# Altium footprint library MyComponents_v2.5.PcbLib: 403 footprints (part 10 of 26)
Each footprint in its own frame and in the unit in brackets; x right, y up, seen from the top. Pads: shape width x height; smd on the part's side, far side on the other; paste and mask are expansions set on the pad; w line width, h text height; cw(c..) or ccw(c..) is an arc to the next point about the centre after c.
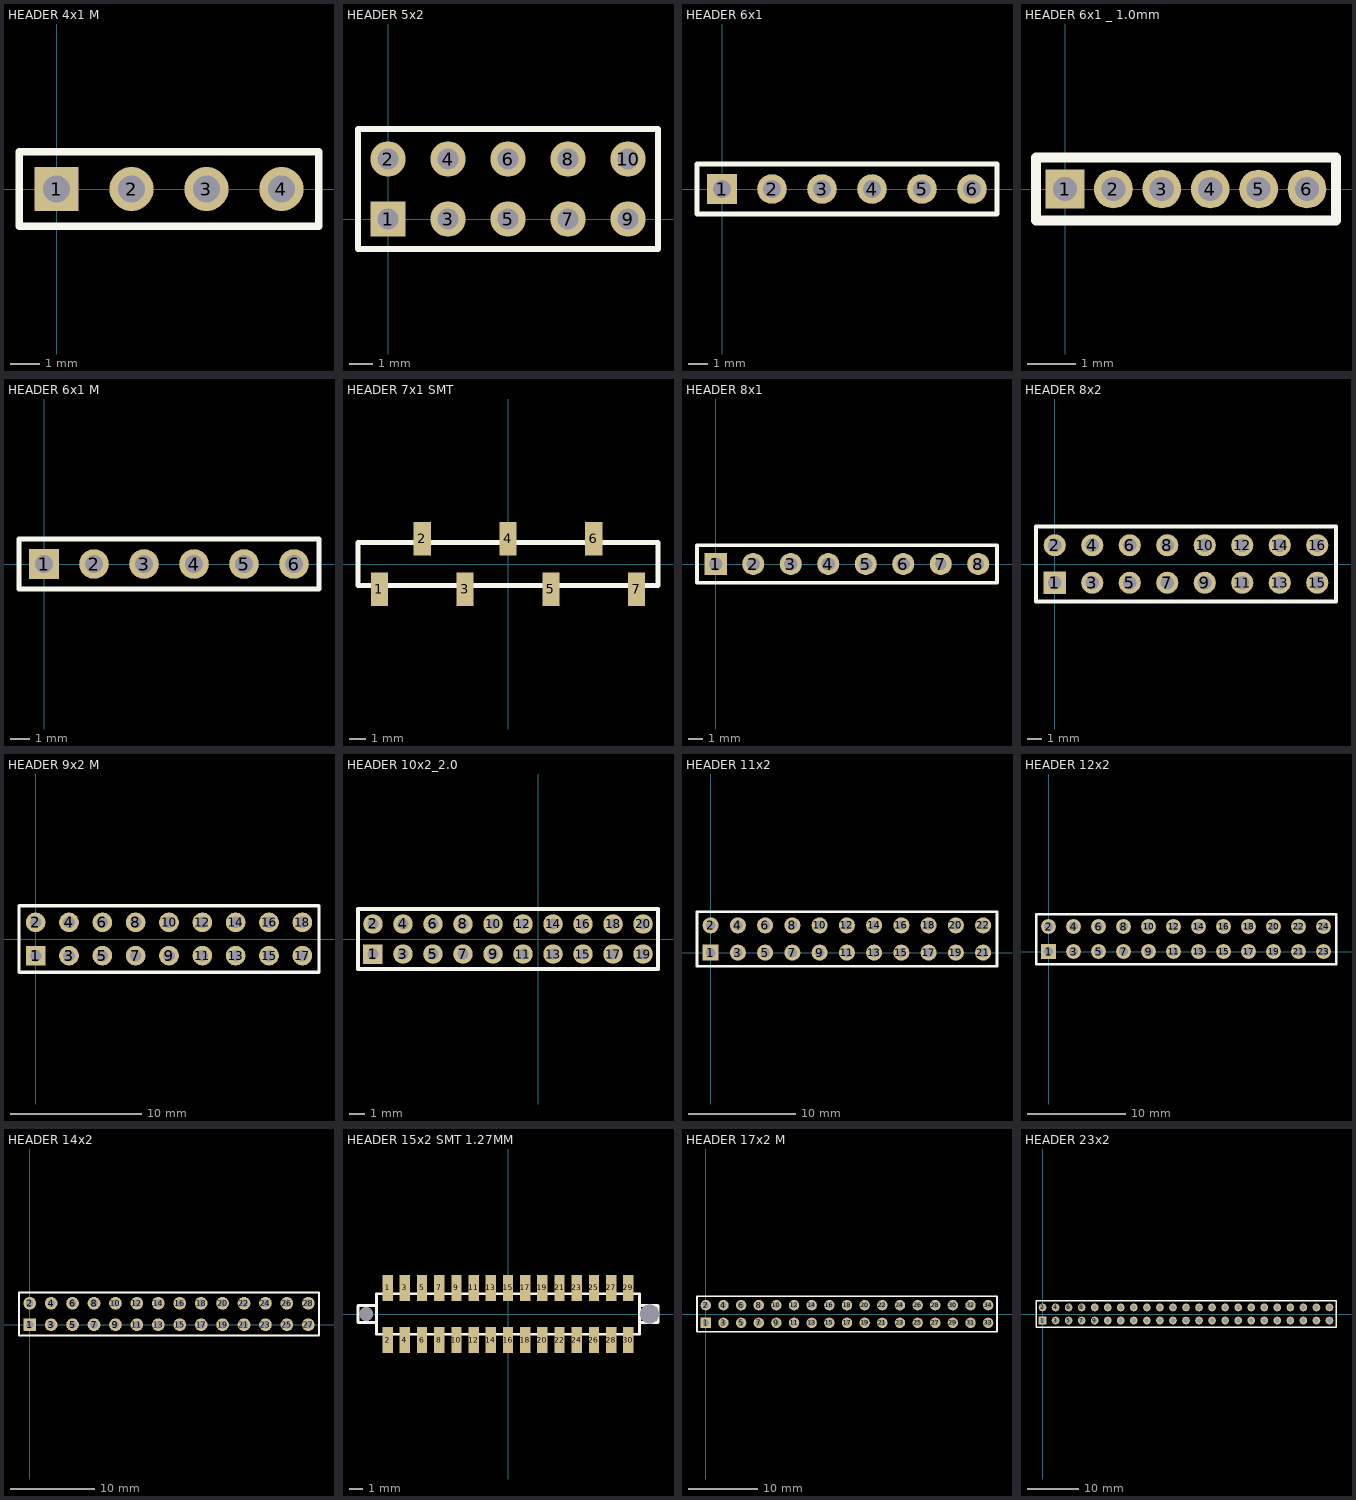
[diagram p9: the footprints below, top view; thin cyan lines are the x and y axes]

## HEADER 4x1 M [mm] "2.54mm排母"
pads (4):
  rect 1.5x1.5 hole 0.9: 1(0,0)
  round 1.5 hole 0.9: 2(2.54,0) 3(5.08,0) 4(7.62,0)
Top Overlay:
  lines w0.254: -1.27,-1.27 8.89,-1.27 8.89,1.27 -1.27,1.27 -1.27,-1.27
3D body "User Library-RM254_4pin.STEP": height 6.02, standoff -3.1, extent -1.27,-1.27 8.89,1.27

## HEADER 5x2 [mm] "2.54mm排针"
pads (10):
  rect 1.5x1.5 hole 0.9: 1(0,0)
  round 1.5 hole 0.9: 2(0,2.54) 3(2.54,0) 4(2.54,2.54) 5(5.08,0) 6(5.08,2.54) 7(7.62,0) 8(7.62,2.54) 9(10.16,0) 10(10.16,2.54)
Top Overlay:
  lines w0.254: -1.27,-1.27 -1.27,3.81 11.43,3.81 11.43,-1.27 -1.27,-1.27
3D body "mill-max-800-10-001-10-002000.STEP": height 6.36, standoff -3.42, extent 8.89,-1.27 11.43,1.27
3D body "mill-max-800-10-001-10-002000.STEP": height 6.36, standoff -3.42, extent 6.35,-1.27 8.89,1.27
3D body "mill-max-800-10-001-10-002000.STEP": height 6.36, standoff -3.42, extent 3.81,-1.27 6.35,1.27
3D body "mill-max-800-10-001-10-002000.STEP": height 6.36, standoff -3.42, extent 1.27,-1.27 3.81,1.27
3D body "mill-max-800-10-001-10-002000.STEP": height 6.36, standoff -3.42, extent 8.89,1.27 11.43,3.81
3D body "mill-max-800-10-001-10-002000.STEP": height 6.36, standoff -3.42, extent 6.35,1.27 8.89,3.81
3D body "mill-max-800-10-001-10-002000.STEP": height 6.36, standoff -3.42, extent 3.81,1.27 6.35,3.81
3D body "mill-max-800-10-001-10-002000.STEP": height 6.36, standoff -3.42, extent 1.27,1.27 3.81,3.81
3D body "mill-max-800-10-001-10-002000.STEP": height 6.36, standoff -3.42, extent -1.27,1.27 1.27,3.81
3D body "mill-max-800-10-001-10-002000.STEP": height 6.36, standoff -3.42, extent -1.27,-1.27 1.27,1.27

## HEADER 6x1 [mm] "2.54mm排针"
pads (6):
  rect 1.5x1.5 hole 0.9: 1(0,0)
  round 1.5 hole 0.9: 2(2.54,0) 3(5.08,0) 4(7.62,0) 5(10.16,0) 6(12.7,0)
Top Overlay:
  lines w0.254: -1.27,-1.27 -1.27,1.27 13.97,1.27 13.97,-1.27 -1.27,-1.27
3D body "mill-max-800-10-001-10-002000.STEP": height 6.39, standoff -3.39, extent -1.27,-1.27 1.27,1.27
3D body "mill-max-800-10-001-10-002000.STEP": height 6.39, standoff -3.39, extent 1.27,-1.27 3.81,1.27
3D body "mill-max-800-10-001-10-002000.STEP": height 6.39, standoff -3.39, extent 3.81,-1.27 6.35,1.27
3D body "mill-max-800-10-001-10-002000.STEP": height 6.39, standoff -3.39, extent 6.35,-1.27 8.89,1.27
3D body "mill-max-800-10-001-10-002000.STEP": height 6.39, standoff -3.39, extent 8.89,-1.27 11.43,1.27
3D body "mill-max-800-10-001-10-002000.STEP": height 6.39, standoff -3.39, extent 11.43,-1.27 13.97,1.27

## HEADER 6x1 _ 1.0mm [mm] "1.0mm 排母"
pads (6):
  rect 0.8x0.8 hole 0.5: 1(0,0)
  round 0.8 hole 0.5: 2(1,0) 3(2,0) 4(3,0) 5(4,0) 6(5,0)
Top Overlay:
  lines w0.2: -0.6,-0.65 5.6,-0.65 5.6,0.65 -0.6,0.65 -0.6,-0.65

## HEADER 6x1 M [mm] "2.54mm 排母"
pads (6):
  rect 1.5x1.5 hole 0.9: 1(0,0)
  round 1.5 hole 0.9: 2(2.54,0) 3(5.08,0) 4(7.62,0) 5(10.16,0) 6(12.7,0)
Top Overlay:
  lines w0.254: -1.27,-1.27 -1.27,1.27 13.97,1.27 13.97,-1.27 -1.27,-1.27
3D body "User Library-RM254_2pin.STEP": height 6.02, standoff -3.1, extent -1.27,-1.27 3.81,1.27
3D body "User Library-RM254_2pin.STEP": height 6.02, standoff -3.1, extent 3.81,-1.27 8.89,1.27
3D body "User Library-RM254_2pin.STEP": height 6.02, standoff -3.1, extent 8.89,-1.27 13.97,1.27

## HEADER 7x1 SMT [mm] "2.54mm贴片排母"
pads (7):
  rect 1.02x2 smd: 1(-7.62,-1.5) 2(-5.08,1.5) 3(-2.54,-1.5) 4(0,1.5) 5(2.54,-1.5) 6(5.08,1.5) 7(7.62,-1.5)
Top Overlay:
  lines w0.3: -8.89,-1.27 8.89,-1.27 8.89,1.27 -8.89,1.27 -8.89,-1.27
3D body "Female header 2.54mm 7.stp": height 6.2, standoff 0, extent -9.02,-2.575 9.02,2.575

## HEADER 8x1 [mm] "2.54mm排针"
pads (8):
  rect 1.5x1.5 hole 0.9: 1(0,0)
  round 1.5 hole 0.9: 2(2.54,0) 3(5.08,0) 4(7.62,0) 5(10.16,0) 6(12.7,0)
  round 1.5 hole 0.8: 7(15.24,0) 8(17.78,0)
Top Overlay:
  lines w0.254: -1.27,-1.27 19.05,-1.27 19.05,1.27 -1.27,1.27 -1.27,-1.27
3D body "mill-max-800-10-001-10-002000.STEP": height 6.39, standoff -3.39, extent 16.51,-1.27 19.05,1.27
3D body "mill-max-800-10-001-10-002000.STEP": height 6.39, standoff -3.39, extent 13.97,-1.27 16.51,1.27
3D body "mill-max-800-10-001-10-002000.STEP": height 6.39, standoff -3.39, extent 11.43,-1.27 13.97,1.27
3D body "mill-max-800-10-001-10-002000.STEP": height 6.39, standoff -3.39, extent 8.89,-1.27 11.43,1.27
3D body "mill-max-800-10-001-10-002000.STEP": height 6.39, standoff -3.39, extent 6.35,-1.27 8.89,1.27
3D body "mill-max-800-10-001-10-002000.STEP": height 6.39, standoff -3.39, extent 3.81,-1.27 6.35,1.27
3D body "mill-max-800-10-001-10-002000.STEP": height 6.39, standoff -3.39, extent 1.27,-1.27 3.81,1.27
3D body "mill-max-800-10-001-10-002000.STEP": height 6.39, standoff -3.39, extent -1.27,-1.27 1.27,1.27

## HEADER 8x2 [mm] "2.54mm排针"
pads (16):
  rect 1.5x1.5 hole 0.9: 1(0,-1.27)
  round 1.5 hole 0.9: 2(0,1.27) 3(2.54,-1.27) 4(2.54,1.27) 5(5.08,-1.27) 6(5.08,1.27) 7(7.62,-1.27) 8(7.62,1.27) 9(10.16,-1.27) 10(10.16,1.27) 11(12.7,-1.27) 12(12.7,1.27) 13(15.24,-1.27) 14(15.24,1.27) 15(17.78,-1.27) 16(17.78,1.27)
Top Overlay:
  lines w0.254: -1.27,-2.54 19.05,-2.54 19.05,2.54 -1.27,2.54 -1.27,-2.54
3D body "mill-max-800-10-004-10-002000.STEP": height 6.41, standoff -3.37, extent -1.27,-2.54 3.81,2.54
3D body "mill-max-800-10-004-10-002000.STEP": height 6.41, standoff -3.37, extent 3.81,-2.54 8.89,2.54
3D body "mill-max-800-10-004-10-002000.STEP": height 6.41, standoff -3.37, extent 8.89,-2.54 13.97,2.54
3D body "mill-max-800-10-004-10-002000.STEP": height 6.41, standoff -3.37, extent 13.97,-2.54 19.05,2.54

## HEADER 9x2 M [mm] "排母"
pads (18):
  rect 1.5x1.5 hole 0.9: 1(0,-1.27)
  round 1.5 hole 0.9: 2(0,1.27) 3(2.54,-1.27) 4(2.54,1.27) 5(5.08,-1.27) 6(5.08,1.27) 7(7.62,-1.27) 8(7.62,1.27) 9(10.16,-1.27) 10(10.16,1.27) 11(12.7,-1.27) 12(12.7,1.27) 13(15.24,-1.27) 14(15.24,1.27) 15(17.78,-1.27) 16(17.78,1.27) 17(20.32,-1.27) 18(20.32,1.27)
Top Overlay:
  lines w0.254: -1.27,-2.54 21.59,-2.54 21.59,2.54 -1.27,2.54 -1.27,-2.54
3D body "User Library-RM254_2pin.STEP": height 6.02, standoff -3.1, extent 19.05,-2.54 21.59,2.54
3D body "User Library-RM254_2pin.STEP": height 6.02, standoff -3.1, extent 16.51,-2.54 19.05,2.54
3D body "User Library-RM254_2pin.STEP": height 6.02, standoff -3.1, extent 13.97,-2.54 16.51,2.54
3D body "User Library-RM254_2pin.STEP": height 6.02, standoff -3.1, extent 11.43,-2.54 13.97,2.54
3D body "User Library-RM254_2pin.STEP": height 6.02, standoff -3.1, extent 8.89,-2.54 11.43,2.54
3D body "User Library-RM254_2pin.STEP": height 6.02, standoff -3.1, extent 6.35,-2.54 8.89,2.54
3D body "User Library-RM254_2pin.STEP": height 6.02, standoff -3.1, extent 3.81,-2.54 6.35,2.54
3D body "User Library-RM254_2pin.STEP": height 6.02, standoff -3.1, extent 1.27,-2.54 3.81,2.54
3D body "User Library-RM254_2pin.STEP": height 6.02, standoff -3.1, extent -1.27,-2.54 1.27,2.54

## HEADER 10x2_2.0 [mm] "2.00mm排针"
pads (20):
  rect 1.3x1.3 hole 0.75: 1(-11,-1)
  round 1.3 hole 0.75: 2(-11,1) 3(-9,-1) 4(-9,1) 5(-7,-1) 6(-7,1) 7(-5,-1) 8(-5,1) 9(-3,-1) 10(-3,1) 11(-1,-1) 12(-1,1) 13(1,-1) 14(1,1) 15(3,-1) 16(3,1) 17(5,-1) 18(5,1) 19(7,-1) 20(7,1)
Top Overlay:
  lines w0.254: -12,-2 -12,2 8,2 8,-2 -12,-2
3D body "Header2.0mm_1x10.STEP": height 4.35, standoff -3.1, extent -12,-2 8,0
3D body "Header2.0mm_1x10.STEP": height 4.35, standoff -3.1, extent -12,0 8,2

## HEADER 11x2 [mm] "2.54mm排针"
pads (22):
  rect 1.5x1.5 hole 0.9: 1(0,0)
  round 1.5 hole 0.9: 2(0,2.54) 3(2.54,0) 4(2.54,2.54) 5(5.08,0) 6(5.08,2.54) 7(7.62,0) 8(7.62,2.54) 9(10.16,0) 10(10.16,2.54) 11(12.7,0) 12(12.7,2.54) 13(15.24,0) 14(15.24,2.54) 15(17.78,0) 16(17.78,2.54) 17(20.32,0) 18(20.32,2.54) 19(22.86,0) 20(22.86,2.54) 21(25.4,0) 22(25.4,2.54)
Top Overlay:
  lines w0.254: -1.27,-1.27 26.7,-1.27 26.7,3.81 -1.27,3.81 -1.27,-1.27
3D body "mill-max-800-10-004-10-002000.STEP": height 6.37, standoff -3.41, extent -1.27,-1.27 3.81,3.81
3D body "mill-max-800-10-004-10-002000.STEP": height 6.37, standoff -3.41, extent 3.81,-1.27 8.89,3.81
3D body "mill-max-800-10-004-10-002000.STEP": height 6.37, standoff -3.41, extent 8.89,-1.27 13.97,3.81
3D body "mill-max-800-10-004-10-002000.STEP": height 6.37, standoff -3.41, extent 13.97,-1.27 19.05,3.81
3D body "mill-max-800-10-004-10-002000.STEP": height 6.37, standoff -3.41, extent 19.05,-1.27 24.13,3.81
3D body "mill-max-800-10-001-10-002000.STEP": height 6.39, standoff -3.39, extent 24.13,-1.27 26.67,1.27
3D body "mill-max-800-10-001-10-002000.STEP": height 6.39, standoff -3.39, extent 24.13,1.27 26.67,3.81

## HEADER 12x2 [mm] "2.54mm排针"
pads (24):
  rect 1.5x1.5 hole 0.9: 1(0,0)
  round 1.5 hole 0.9: 2(0,2.54) 3(2.54,0) 4(2.54,2.54) 5(5.08,0) 6(5.08,2.54) 7(7.62,0) 8(7.62,2.54) 9(10.16,0) 10(10.16,2.54) 11(12.7,0) 12(12.7,2.54) 13(15.24,0) 14(15.24,2.54) 15(17.78,0) 16(17.78,2.54) 17(20.32,0) 18(20.32,2.54) 19(22.86,0) 20(22.86,2.54) 21(25.4,0) 22(25.4,2.54) 23(27.94,0) 24(27.94,2.54)
Top Overlay:
  lines w0.254: -1.27,-1.27 -1.27,3.81 29.21,3.81 29.21,-1.27 -1.27,-1.27
3D body "mill-max-800-10-004-10-002000.STEP": height 6.37, standoff -3.41, extent 19.05,-1.27 24.13,3.81
3D body "mill-max-800-10-004-10-002000.STEP": height 6.37, standoff -3.41, extent 13.97,-1.27 19.05,3.81
3D body "mill-max-800-10-004-10-002000.STEP": height 6.37, standoff -3.41, extent 8.89,-1.27 13.97,3.81
3D body "mill-max-800-10-004-10-002000.STEP": height 6.37, standoff -3.41, extent 3.81,-1.27 8.89,3.81
3D body "mill-max-800-10-004-10-002000.STEP": height 6.37, standoff -3.41, extent -1.27,-1.27 3.81,3.81
3D body "mill-max-800-10-004-10-002000.STEP": height 6.37, standoff -3.41, extent 24.13,-1.27 29.21,3.81

## HEADER 14x2 [mm] "2.54mm排针"
pads (28):
  rect 1.5x1.5 hole 0.9: 1(0,0)
  round 1.5 hole 0.9: 2(0,2.54) 3(2.54,0) 4(2.54,2.54) 5(5.08,0) 6(5.08,2.54) 7(7.62,0) 8(7.62,2.54) 9(10.16,0) 10(10.16,2.54) 11(12.7,0) 12(12.7,2.54) 13(15.24,0) 14(15.24,2.54) 15(17.78,0) 16(17.78,2.54) 17(20.32,0) 18(20.32,2.54) 19(22.86,0) 20(22.86,2.54) 21(25.4,0) 22(25.4,2.54) 23(27.94,0) 24(27.94,2.54) 25(30.48,0) 26(30.48,2.54) 27(33.02,0) 28(33.02,2.54)
Top Overlay:
  lines w0.254: -1.27,-1.27 -1.27,3.81 34.29,3.81 34.29,-1.27 -1.27,-1.27
3D body "mill-max-800-10-004-10-002000.STEP": height 6.37, standoff -3.41, extent 29.21,-1.27 34.29,3.81
3D body "mill-max-800-10-004-10-002000.STEP": height 6.37, standoff -3.41, extent 24.13,-1.27 29.21,3.81
3D body "mill-max-800-10-004-10-002000.STEP": height 6.37, standoff -3.41, extent 19.05,-1.27 24.13,3.81
3D body "mill-max-800-10-004-10-002000.STEP": height 6.37, standoff -3.41, extent 13.97,-1.27 19.05,3.81
3D body "mill-max-800-10-004-10-002000.STEP": height 6.37, standoff -3.41, extent 8.89,-1.27 13.97,3.81
3D body "mill-max-800-10-004-10-002000.STEP": height 6.37, standoff -3.41, extent 3.81,-1.27 8.89,3.81
3D body "mill-max-800-10-004-10-002000.STEP": height 6.37, standoff -3.41, extent -1.27,-1.27 3.81,3.81

## HEADER 15x2 SMT 1.27MM [mm] "2.54mm排针"
pads (30):
  rect 0.76x1.95 smd: 1(-8.89,1.925) 2(-8.89,-1.925) 3(-7.62,1.925) 4(-7.62,-1.925) 5(-6.35,1.925) 6(-6.35,-1.925) 7(-5.08,1.925) 8(-5.08,-1.925) 9(-3.81,1.925) 10(-3.81,-1.925) 11(-2.54,1.925) 12(-2.54,-1.925) 13(-1.27,1.925) 14(-1.27,-1.925) 15(0,1.925) 16(0,-1.925) 17(1.27,1.925) 18(1.27,-1.925) 19(2.54,1.925) 20(2.54,-1.925) 21(3.81,1.925) 22(3.81,-1.925) 23(5.08,1.925) 24(5.08,-1.925) 25(6.35,1.925) 26(6.35,-1.925) 27(7.62,1.925) 28(7.62,-1.925) 29(8.89,1.925) 30(8.89,-1.925)
via -10.465,0 diameter 1 hole 1
via 10.465,0 diameter 1.4 hole 1.4
via 10.465,0 diameter 1 hole 1
Top Overlay:
  lines w0.2: -9.725,-0.635 -11.085,-0.635 -11.085,0.635 -9.725,0.635 ; 9.725,-0.635 11.085,-0.635 11.085,0.635 9.725,0.635 ; -9.725,-1.5 -9.725,1.5 9.725,1.5 9.725,-1.5 -9.725,-1.5
3D body: height 6, standoff 0.1, extent -11.175,-2.25 11.175,2.35

## HEADER 17x2 M [mm] "34pin排母"
pads (34):
  rect 1.5x1.5 hole 0.9: 1(0,-1.27)
  round 1.5 hole 0.9: 2(0,1.27) 3(2.54,-1.27) 4(2.54,1.27) 5(5.08,-1.27) 6(5.08,1.27) 7(7.62,-1.27) 8(7.62,1.27) 9(10.16,-1.27) 10(10.16,1.27) 11(12.7,-1.27) 12(12.7,1.27) 13(15.24,-1.27) 14(15.24,1.27) 15(17.78,-1.27) 16(17.78,1.27) 17(20.32,-1.27) 18(20.32,1.27) 19(22.86,-1.27) 20(22.86,1.27) 21(25.4,-1.27) 22(25.4,1.27) 23(27.94,-1.27) 24(27.94,1.27) 25(30.48,-1.27) 26(30.48,1.27) 27(33.02,-1.27) 28(33.02,1.27) 29(35.56,-1.27) 30(35.56,1.27) 31(38.1,-1.27) 32(38.1,1.27) 33(40.64,-1.27) 34(40.64,1.27)
Top Overlay:
  lines w0.254: -1.27,-2.54 -1.27,2.54 41.91,2.54 41.91,-2.54 -1.27,-2.54
3D body "User Library-RM254_2pin.STEP": height 6.02, standoff -3.1, extent 39.37,-2.54 41.91,2.54
3D body "User Library-RM254_2pin.STEP": height 6.02, standoff -3.1, extent 36.83,-2.54 39.37,2.54
3D body "User Library-RM254_2pin.STEP": height 6.02, standoff -3.1, extent 34.29,-2.54 36.83,2.54
3D body "User Library-RM254_2pin.STEP": height 6.02, standoff -3.1, extent 31.75,-2.54 34.29,2.54
3D body "User Library-RM254_2pin.STEP": height 6.02, standoff -3.1, extent 29.21,-2.54 31.75,2.54
3D body "User Library-RM254_2pin.STEP": height 6.02, standoff -3.1, extent 26.67,-2.54 29.21,2.54
3D body "User Library-RM254_2pin.STEP": height 6.02, standoff -3.1, extent 24.13,-2.54 26.67,2.54
3D body "User Library-RM254_2pin.STEP": height 6.02, standoff -3.1, extent 21.59,-2.54 24.13,2.54
3D body "User Library-RM254_2pin.STEP": height 6.02, standoff -3.1, extent 19.05,-2.54 21.59,2.54
3D body "User Library-RM254_2pin.STEP": height 6.02, standoff -3.1, extent 16.51,-2.54 19.05,2.54
3D body "User Library-RM254_2pin.STEP": height 6.02, standoff -3.1, extent 13.97,-2.54 16.51,2.54
3D body "User Library-RM254_2pin.STEP": height 6.02, standoff -3.1, extent 11.43,-2.54 13.97,2.54
3D body "User Library-RM254_2pin.STEP": height 6.02, standoff -3.1, extent 8.89,-2.54 11.43,2.54
3D body "User Library-RM254_2pin.STEP": height 6.02, standoff -3.1, extent 6.35,-2.54 8.89,2.54
3D body "User Library-RM254_2pin.STEP": height 6.02, standoff -3.1, extent 3.81,-2.54 6.35,2.54
3D body "User Library-RM254_2pin.STEP": height 6.02, standoff -3.1, extent 1.27,-2.54 3.81,2.54
3D body "User Library-RM254_2pin.STEP": height 6.02, standoff -3.1, extent -1.27,-2.54 1.27,2.54

## HEADER 23x2 [mm] "2.54mm排针"
pads (46):
  rect 1.5x1.5 hole 0.9: 1(0,-1.27)
  round 1.5 hole 0.9: 2(0,1.27) 3(2.54,-1.27) 4(2.54,1.27) 5(5.08,-1.27) 6(5.08,1.27) 7(7.62,-1.27) 8(7.62,1.27) 9(10.16,-1.27) 10(10.16,1.27) 11(12.7,-1.27) 12(12.7,1.27) 13(15.24,-1.27) 14(15.24,1.27) 15(17.78,-1.27) 16(17.78,1.27) 17(20.32,-1.27) 18(20.32,1.27) 19(22.86,-1.27) 20(22.86,1.27) 21(25.4,-1.27) 22(25.4,1.27) 23(27.94,-1.27) 24(27.94,1.27) 25(30.48,-1.27) 26(30.48,1.27) 27(33.02,-1.27) 28(33.02,1.27) 29(35.56,-1.27) 30(35.56,1.27) 31(38.1,-1.27) 32(38.1,1.27) 33(40.64,-1.27) 34(40.64,1.27) 35(43.18,-1.27) 36(43.18,1.27) 37(45.72,-1.27) 38(45.72,1.27) 39(48.26,-1.27) 40(48.26,1.27) 41(50.8,-1.27) 42(50.8,1.27) 43(53.34,-1.27) 44(53.34,1.27) 45(55.88,-1.27) 46(55.88,1.27)
Top Overlay:
  lines w0.254: -1.27,-2.54 -1.27,2.54 57.15,2.54 57.15,-2.54 -1.27,-2.54
3D body "Header23x2.stp": height 2.23, standoff -8.57, extent -1.048,-2.415 56.972,2.415
3D body: height 5.47, standoff -7.16, extent 26.035,5.969 26.035,5.969